# Altium footprint library Generic Footprint.PcbLib: 160 footprints (part 17 of 20) (continued)
## Symbol_FCC-Logo-9x6mm_Silkscreen [mm] (continued)
1(0.072,3.185) 1(0.072,3.195) 1(0.072,3.205) 1(0.072,3.215) 1(0.072,3.225) 1(0.072,3.236) 1(0.072,3.246) 1(0.072,3.256) 1(0.072,3.266) 1(0.072,3.276) 1(0.072,3.287) 1(0.072,3.297) 1(0.072,3.307) 1(0.072,3.317) 1(0.072,3.327) 1(0.072,3.338) 1(0.072,3.348) 1(0.072,3.358) 1(0.072,3.368) 1(0.072,3.378) 1(0.072,3.389) 1(0.072,3.399) 1(0.072,3.409) 1(0.072,3.419) 1(0.072,3.429) 1(0.072,3.44) 1(0.072,3.45) 1(0.072,3.46) 1(0.072,3.47) 1(0.072,3.48) 1(0.072,3.491) 1(0.072,3.501) 1(0.072,3.511) 1(0.072,3.521) 1(0.072,3.531) 1(0.072,3.542) 1(0.072,3.552) 1(0.072,3.562) 1(0.072,3.572) 1(0.072,3.582) 1(0.072,3.593) 1(0.072,3.603) 1(0.072,3.613) 1(0.072,3.623) 1(0.072,3.633) 1(0.072,3.644) 1(0.072,3.654) 1(0.072,3.664) 1(0.072,3.674) 1(0.072,3.684) 1(0.072,3.695) 1(0.072,3.705) 1(0.072,3.715) 1(0.072,3.725) 1(0.072,3.735) 1(0.072,3.746) 1(0.072,3.756) 1(0.072,3.766) 1(0.072,3.776) 1(0.072,3.786) 1(0.072,3.797) 1(0.072,3.807) 1(0.072,3.817) 1(0.072,3.827) 1(0.072,3.837) 1(0.072,3.848) 1(0.072,3.858) 1(0.072,3.868) 1(0.072,3.878) 1(0.072,3.888) 1(0.072,3.899) 1(0.072,3.909) 1(0.072,3.919) 1(0.072,3.929) 1(0.072,3.939) 1(0.072,3.95) 1(0.072,3.96) 1(0.072,3.97) 1(0.072,3.98) 1(0.072,3.99) 1(0.072,4.001) 1(0.072,4.011) 1(0.072,4.021) 1(0.072,4.031) 1(0.072,4.041) 1(0.072,4.052) 1(0.072,4.062) 1(0.072,4.072) 1(0.072,4.082) 1(0.072,4.092) 1(0.072,4.103) 1(0.072,4.113) 1(0.072,4.123) 1(0.072,4.133) 1(0.072,4.143) 1(0.072,4.154) 1(0.072,4.164) 1(0.072,4.174) 1(0.072,4.184) 1(0.072,4.194) 1(0.072,4.205) 1(0.072,4.215) 1(0.072,4.225) 1(0.072,4.235) 1(0.072,4.245) 1(0.072,4.256) 1(0.072,4.266) 1(0.072,4.276) 1(0.072,4.286) 1(0.072,4.296) 1(0.072,4.307) 1(0.072,4.317) 1(0.072,4.327) 1(0.072,4.337) 1(0.072,4.347) 1(0.072,4.358) 1(0.072,4.368) 1(0.072,4.378) 1(0.072,4.388) 1(0.072,4.398) 1(0.072,4.409) 1(0.072,4.419) 1(0.072,4.429) 1(0.072,4.439) 1(0.072,4.449) 1(0.072,4.46) 1(0.072,4.47) 1(0.072,4.48) 1(0.072,4.49) 1(0.072,4.5) 1(0.072,4.511) 1(0.072,4.521) 1(0.072,4.531) 1(0.072,4.541) 1(0.072,4.551) 1(0.072,4.562) 1(0.072,4.572) 1(0.072,4.582) 1(0.072,4.592) 1(0.072,4.602) 1(0.072,4.613) 1(0.072,4.623) 1(0.072,4.633) 1(0.072,4.643) 1(0.072,4.653) 1(0.072,4.664) 1(0.072,4.674) 1(0.072,4.684) 1(0.072,4.694) 1(0.072,4.704) 1(0.072,4.715) 1(0.072,4.725) 1(0.072,4.735) 1(0.072,4.745) 1(0.072,4.755) 1(0.072,4.766) 1(0.072,4.776) 1(0.072,4.786) 1(0.072,4.796) 1(0.072,4.806) 1(0.072,4.817) 1(0.072,4.827) 1(0.072,4.837) 1(0.072,4.847) 1(0.072,4.857) 1(0.072,4.868) 1(0.072,4.878) 1(0.072,4.888) 1(0.072,4.898) 1(0.072,4.908) 1(0.072,4.919) 1(0.072,4.929) 1(0.072,4.939) 1(0.072,4.949) 1(0.072,4.959) 1(0.072,4.97) 1(0.072,4.98) 1(0.072,4.99) 1(0.072,5) 1(0.072,5.01) 1(0.072,5.021) 1(0.072,5.031) 1(0.072,5.041) 1(0.072,5.051) 1(0.072,5.061) 1(0.072,5.072) 1(0.072,5.082) 1(0.072,5.092) 1(0.072,5.102) 1(0.072,5.112) 1(0.072,5.123) 1(0.072,5.133) 1(0.072,5.143) 1(0.072,5.153) 1(0.072,5.163) 1(0.072,5.174) 1(0.072,5.184) 1(0.072,5.194) 1(0.072,5.204) 1(0.072,5.214) 1(0.072,5.225) 1(0.072,5.235) 1(0.072,5.245) 1(0.072,5.255) 1(0.072,5.265) 1(0.072,5.276) 1(0.072,5.286) 1(0.072,5.296) 1(0.072,5.306) 1(0.072,5.316) 1(0.072,5.327) 1(0.072,5.337) 1(0.072,5.347) 1(0.072,5.357) 1(0.072,5.367) 1(0.072,5.378) 1(0.072,5.388) 1(0.072,5.398) 1(0.072,5.408) 1(0.072,5.418) 1(0.072,5.429) 1(0.072,5.439) 1(0.072,5.449) 1(0.072,5.459) 1(0.072,5.48) 1(0.072,5.49) 1(0.072,5.5) 1(0.072,5.51) 1(0.072,5.52) 1(0.072,5.531) 1(0.072,5.541) 1(0.072,5.551) 1(0.083,0.104) 1(0.083,0.114) 1(0.083,0.125) 1(0.083,0.145) 1(0.083,5.49) 1(0.083,5.5) 1(0.083,5.51) 1(0.083,5.52) 1(0.083,5.531) 1(0.083,5.541) 1(0.083,5.551) 1(0.083,5.571) 1(0.083,5.582) 1(0.083,5.592) 1(0.093,0.114) 1(0.093,0.125) 1(0.093,0.135) 1(0.093,5.531) 1(0.093,5.541) 1(0.093,5.551) 1(0.093,5.561) 1(0.093,5.571) 1(0.093,5.582) 1(0.093,5.592) 1(0.093,5.612) 1(0.093,5.643) 1(0.103,0.094) 1(0.103,0.104) 1(0.103,5.571) 1(0.103,5.582) 1(0.103,5.592) 1(0.103,5.602) 1(0.103,5.612) 1(0.103,5.633) 1(0.113,0.084) 1(0.113,0.094) 1(0.113,0.104) 1(0.113,5.643) 1(0.113,5.663) 1(0.113,5.673) 1(0.113,5.684) 1(0.123,5.612) 1(0.123,5.622) 1(0.123,5.694) 1(0.134,0.074) 1(0.134,5.643) 1(0.134,5.653) 1(0.134,5.704) 1(0.134,5.714) 1(0.134,5.724) 1(0.134,5.735) 1(0.144,0.084) 1(0.144,0.094) 1(0.144,5.714) 1(0.144,5.724) 1(0.144,5.735) 1(0.144,5.755) 1(0.154,0.063) 1(0.154,5.714) 1(0.154,5.724) 1(0.154,5.735) 1(0.154,5.755) 1(0.164,0.074) 1(0.164,0.084) 1(0.174,5.745) 1(0.174,5.755) 1(0.174,5.796) 1(0.185,0.053) 1(0.185,5.765) 1(0.185,5.775) 1(0.185,5.786) 1(0.185,5.796) 1(0.185,5.816) 1(0.185,5.826) 1(0.185,5.837) 1(0.185,5.847) 1(0.195,0.043) 1(0.195,0.063) 1(0.195,0.074) 1(0.195,5.796) 1(0.195,5.806) 1(0.195,5.816) 1(0.195,5.826) 1(0.195,5.857) 1(0.205,5.816) 1(0.205,5.826) 1(0.205,5.847) 1(0.205,5.857) 1(0.205,5.867) 1(0.215,5.847) 1(0.215,5.857) 1(0.215,5.877) 1(0.225,5.888) 1(0.225,5.898) 1(0.236,5.898) 1(0.236,5.908) 1(0.246,5.898) 1(0.246,5.908) 1(0.246,5.928) 1(0.246,5.939) 1(0.256,5.908) 1(0.256,5.928) 1(0.256,5.939) 1(0.256,5.959) 1(0.266,5.918) 1(0.266,5.949) 1(0.266,5.969) 1(0.276,5.928) 1(0.276,5.939) 1(0.276,5.949) 1(0.276,5.959) 1(0.287,5.949) 1(0.287,5.959) 1(0.287,5.979) 1(0.287,5.99) 1(0.287,6) 1(0.297,6.01) 1(0.307,6.02) 1(0.327,6.041) 1(0.327,6.051) 1(0.338,6.041) 1(0.338,6.051) 1(0.338,6.061) 1(0.348,6.03) 1(0.348,6.041) 1(0.348,6.061) 1(0.348,6.071) 1(0.358,6.051) 1(0.358,6.071) 1(0.358,6.081) 1(0.368,6.061) 1(0.368,6.071) 1(0.368,6.092) 1(0.378,6.081) 1(0.378,6.102) 1(0.389,6.081) 1(0.389,6.112) 1(0.399,6.122) 1(0.409,6.112) 1(0.409,6.132) 1(0.419,6.112) 1(0.419,6.122) 1(0.419,6.143) 1(0.429,6.122) 1(0.429,6.132) 1(0.429,6.153) 1(0.44,6.132) 1(0.44,6.143) 1(0.44,6.153) 1(0.44,6.163) 1(0.45,6.143) 1(0.45,6.163) 1(0.45,6.173) 1(0.46,6.153) 1(0.46,6.183) 1(0.47,6.163) 1(0.48,6.194) 1(0.491,6.204) 1(0.501,6.214) 1(0.511,6.204) 1(0.521,6.224) 1(0.531,6.204) 1(0.531,6.234) 1(0.542,6.245) 1(0.552,6.234) 1(0.552,6.245) 1(0.552,6.255) 1(0.572,6.234) 1(0.572,6.255) 1(0.572,6.265) 1(0.582,6.245) 1(0.603,6.255) 1(0.603,6.275) 1(0.613,6.285) 1(0.623,6.296) 1(0.654,6.285) 1(0.654,6.296) 1(0.654,6.306) 1(0.674,6.285) 1(0.674,6.296) 1(0.684,6.306) 1(0.684,6.316) 1(0.705,6.306) 1(0.705,6.316) 1(0.705,6.326) 1(0.746,6.316) 1(0.746,6.326) 1(0.746,6.336) 1(0.776,6.347) 1(0.786,6.326) 1(0.786,6.357) 1(0.797,6.336) 1(0.848,6.336) 1(0.858,6.367) 1(1.062,0.053) 1(1.062,0.094) 1(1.062,0.104) 1(1.062,0.114) 1(1.062,0.125) 1(1.062,0.135) 1(1.062,0.145) 1(1.062,0.155) 1(1.062,0.165) 1(1.062,0.176) 1(1.062,0.186) 1(1.062,0.196) 1(1.062,0.206) 1(1.062,0.216) 1(1.062,0.227) 1(1.062,0.237) 1(1.062,0.247) 1(1.062,0.257) 1(1.062,0.267) 1(1.062,0.278) 1(1.062,0.288) 1(1.062,0.298) 1(1.062,0.308) 1(1.062,0.318) 1(1.062,0.329) 1(1.062,0.339) 1(1.062,0.349) 1(1.062,0.359) 1(1.062,0.369) 1(1.062,0.38) 1(1.062,0.39) 1(1.062,0.4) 1(1.062,0.41) 1(1.062,0.42) 1(1.062,0.431) 1(1.062,0.441) 1(1.062,0.451) 1(1.062,0.461) 1(1.062,0.471) 1(1.062,0.482) 1(1.062,0.492) 1(1.062,0.502) 1(1.062,0.512) 1(1.062,0.522) 1(1.062,0.533) 1(1.062,0.543) 1(1.062,0.553) 1(1.062,0.563) 1(1.062,0.573) 1(1.062,0.584) 1(1.062,0.594) 1(1.062,0.604) 1(1.062,0.614) 1(1.062,0.624) 1(1.062,0.635) 1(1.062,0.645) 1(1.062,0.655) 1(1.062,0.665) 1(1.062,0.675) 1(1.062,0.686) 1(1.062,0.696) 1(1.062,0.706) 1(1.062,0.716) 1(1.062,0.726) 1(1.062,0.737) 1(1.062,0.747) 1(1.062,0.757) 1(1.062,0.767) 1(1.062,0.777) 1(1.062,0.788) 1(1.062,0.798) 1(1.062,0.808) 1(1.062,0.818) 1(1.062,0.828) 1(1.062,0.839) 1(1.062,0.849) 1(1.062,0.859) 1(1.062,0.869) 1(1.062,0.879) 1(1.062,0.89) 1(1.062,0.9) 1(1.062,0.91) 1(1.062,0.92) 1(1.062,0.93) 1(1.062,0.941) 1(1.062,0.951) 1(1.062,0.961) 1(1.062,0.971) 1(1.062,0.981) 1(1.062,0.992) 1(1.062,1.002) 1(1.062,1.012) 1(1.062,1.022) 1(1.062,1.032) 1(1.062,1.043) 1(1.062,1.053) 1(1.062,1.063) 1(1.062,1.073) 1(1.062,1.083) 1(1.062,1.094) 1(1.062,1.104) 1(1.062,1.114) 1(1.062,1.124) 1(1.062,1.134) 1(1.062,1.145) 1(1.062,1.155) 1(1.062,1.165) 1(1.062,1.175) 1(1.062,1.185) 1(1.062,1.196) 1(1.062,1.206) 1(1.062,1.216) 1(1.062,1.226) 1(1.062,1.236) 1(1.062,1.247) 1(1.062,1.257) 1(1.062,1.267) 1(1.062,1.277) 1(1.062,1.287) 1(1.062,1.298) 1(1.062,1.308) 1(1.062,1.318) 1(1.062,1.328) 1(1.062,1.338) 1(1.062,1.349) 1(1.062,1.359) 1(1.062,1.369) 1(1.062,1.379) 1(1.062,1.389) 1(1.062,1.4) 1(1.062,1.41) 1(1.062,1.42) 1(1.062,1.43) 1(1.062,1.44) 1(1.062,1.451) 1(1.062,1.461) 1(1.062,1.471) 1(1.062,1.481) 1(1.062,1.491) 1(1.062,1.502) 1(1.062,1.512) 1(1.062,1.522) 1(1.062,1.532) 1(1.062,1.542) 1(1.062,1.553) 1(1.062,1.563) 1(1.062,1.573) 1(1.062,1.583) 1(1.062,1.593) 1(1.062,1.604) 1(1.062,1.614) 1(1.062,1.624) 1(1.062,1.634) 1(1.062,1.644) 1(1.062,1.655) 1(1.062,1.665) 1(1.062,1.675) 1(1.062,1.685) 1(1.062,1.695) 1(1.062,1.706) 1(1.062,1.716) 1(1.062,1.726) 1(1.062,1.736) 1(1.062,1.746) 1(1.062,1.757) 1(1.062,1.767) 1(1.062,1.777) 1(1.062,1.787) 1(1.062,1.797) 1(1.062,1.808) 1(1.062,1.818) 1(1.062,1.828) 1(1.062,1.838) 1(1.062,1.848) 1(1.062,1.859) 1(1.062,1.869) 1(1.062,1.879) 1(1.062,1.889) 1(1.062,1.899) 1(1.062,1.91) 1(1.062,1.92) 1(1.062,1.93) 1(1.062,1.94) 1(1.062,1.95) 1(1.062,1.961) 1(1.062,1.971) 1(1.062,1.981) 1(1.062,1.991) 1(1.062,2.001) 1(1.062,2.012) 1(1.062,2.022) 1(1.062,2.032) 1(1.062,2.042) 1(1.062,2.052) 1(1.062,2.063) 1(1.062,2.073) 1(1.062,2.083) 1(1.062,2.093) 1(1.062,2.103) 1(1.062,2.114) 1(1.062,2.124) 1(1.062,2.134) 1(1.062,2.144) 1(1.062,2.154) 1(1.062,2.165) 1(1.062,2.175) 1(1.062,2.185) 1(1.062,2.195) 1(1.062,2.205) 1(1.062,2.216) 1(1.062,2.226) 1(1.062,2.236) 1(1.062,2.246) 1(1.062,2.256) 1(1.062,2.267) 1(1.062,2.277) 1(1.062,2.287) 1(1.062,2.297) 1(1.062,2.307) 1(1.062,2.318) 1(1.062,2.328) 1(1.062,2.338) 1(1.062,2.348) 1(1.062,2.358) 1(1.062,2.369) 1(1.062,2.379) 1(1.062,2.389) 1(1.062,2.399) 1(1.062,2.409) 1(1.062,2.42) 1(1.062,2.43) 1(1.062,2.44) 1(1.062,2.45) 1(1.062,2.46) 1(1.062,2.471) 1(1.062,2.481) 1(1.062,2.491) 1(1.062,2.501) 1(1.062,2.511) 1(1.062,2.522) 1(1.062,2.532) 1(1.062,2.542) 1(1.062,2.552) 1(1.062,2.562) 1(1.062,2.573) 1(1.062,2.583) 1(1.062,2.593) 1(1.062,2.603) 1(1.062,2.613) 1(1.062,2.624) 1(1.062,2.634) 1(1.062,2.644) 1(1.062,2.654) 1(1.062,2.675) 1(1.062,5.133) 1(1.062,5.143) 1(1.072,0.043) 1(1.072,0.094) 1(1.072,0.104) 1(1.072,0.114) 1(1.072,0.125) 1(1.072,0.135) 1(1.072,0.145) 1(1.072,0.155) 1(1.072,0.165) 1(1.072,0.176) 1(1.072,0.186) 1(1.072,0.196) 1(1.072,0.206) 1(1.072,0.216) 1(1.072,0.227) 1(1.072,0.237) 1(1.072,0.247) 1(1.072,0.257) 1(1.072,0.267) 1(1.072,0.278) 1(1.072,0.288) 1(1.072,0.298) 1(1.072,0.308) 1(1.072,0.318) 1(1.072,0.329) 1(1.072,0.339) 1(1.072,0.349) 1(1.072,0.359) 1(1.072,0.369) 1(1.072,0.38) 1(1.072,0.39) 1(1.072,0.4) 1(1.072,0.41) 1(1.072,0.42) 1(1.072,0.431) 1(1.072,0.441) 1(1.072,0.451) 1(1.072,0.461) 1(1.072,0.471) 1(1.072,0.482) 1(1.072,0.492) 1(1.072,0.502) 1(1.072,0.512) 1(1.072,0.522) 1(1.072,0.533) 1(1.072,0.543) 1(1.072,0.553) 1(1.072,0.563) 1(1.072,0.573) 1(1.072,0.584) 1(1.072,0.594) 1(1.072,0.604) 1(1.072,0.614) 1(1.072,0.624) 1(1.072,0.635) 1(1.072,0.645) 1(1.072,0.655) 1(1.072,0.665) 1(1.072,0.675) 1(1.072,0.686) 1(1.072,0.696) 1(1.072,0.706) 1(1.072,0.716) 1(1.072,0.726) 1(1.072,0.737) 1(1.072,0.747) 1(1.072,0.757) 1(1.072,0.767) 1(1.072,0.777) 1(1.072,0.788) 1(1.072,0.798) 1(1.072,0.808) 1(1.072,0.818) 1(1.072,0.828) 1(1.072,0.839) 1(1.072,0.849) 1(1.072,0.859) 1(1.072,0.869) 1(1.072,0.879) 1(1.072,0.89) 1(1.072,0.9) 1(1.072,0.91) 1(1.072,0.92) 1(1.072,0.93) 1(1.072,0.941) 1(1.072,0.951) 1(1.072,0.961) 1(1.072,0.971) 1(1.072,0.981) 1(1.072,0.992) 1(1.072,1.002) 1(1.072,1.012) 1(1.072,1.022) 1(1.072,1.032) 1(1.072,1.043) 1(1.072,1.053) 1(1.072,1.063) 1(1.072,1.073) 1(1.072,1.083) 1(1.072,1.094) 1(1.072,1.104) 1(1.072,1.114) 1(1.072,1.124) 1(1.072,1.134) 1(1.072,1.145) 1(1.072,1.155) 1(1.072,1.165) 1(1.072,1.175) 1(1.072,1.185) 1(1.072,1.196) 1(1.072,1.206) 1(1.072,1.216) 1(1.072,1.226) 1(1.072,1.236) 1(1.072,1.247) 1(1.072,1.257) 1(1.072,1.267) 1(1.072,1.277) 1(1.072,1.287) 1(1.072,1.298) 1(1.072,1.308) 1(1.072,1.318) 1(1.072,1.328) 1(1.072,1.338) 1(1.072,1.349) 1(1.072,1.359) 1(1.072,1.369) 1(1.072,1.379) 1(1.072,1.389) 1(1.072,1.4) 1(1.072,1.41) 1(1.072,1.42) 1(1.072,1.43) 1(1.072,1.44) 1(1.072,1.451) 1(1.072,1.461) 1(1.072,1.471) 1(1.072,1.481) 1(1.072,1.491) 1(1.072,1.502) 1(1.072,1.512) 1(1.072,1.522) 1(1.072,1.532) 1(1.072,1.542) 1(1.072,1.553) 1(1.072,1.563) 1(1.072,1.573) 1(1.072,1.583) 1(1.072,1.593) 1(1.072,1.604) 1(1.072,1.614) 1(1.072,1.624) 1(1.072,1.634) 1(1.072,1.644) 1(1.072,1.655) 1(1.072,1.665) 1(1.072,1.675) 1(1.072,1.685) 1(1.072,1.695) 1(1.072,1.706) 1(1.072,1.716) 1(1.072,1.726) 1(1.072,1.736) 1(1.072,1.746) 1(1.072,1.757) 1(1.072,1.767) 1(1.072,1.777) 1(1.072,1.787) 1(1.072,1.797) 1(1.072,1.808) 1(1.072,1.818) 1(1.072,1.828) 1(1.072,1.838) 1(1.072,1.848) 1(1.072,1.859) 1(1.072,1.869) 1(1.072,1.879) 1(1.072,1.889) 1(1.072,1.899) 1(1.072,1.91) 1(1.072,1.92) 1(1.072,1.93) 1(1.072,1.94) 1(1.072,1.95) 1(1.072,1.961) 1(1.072,1.971) 1(1.072,1.981) 1(1.072,1.991) 1(1.072,2.001) 1(1.072,2.012) 1(1.072,2.022) 1(1.072,2.032) 1(1.072,2.042) 1(1.072,2.052) 1(1.072,2.063) 1(1.072,2.073) 1(1.072,2.083) 1(1.072,2.093) 1(1.072,2.103) 1(1.072,2.114) 1(1.072,2.124) 1(1.072,2.134) 1(1.072,2.144) 1(1.072,2.154) 1(1.072,2.165) 1(1.072,2.175) 1(1.072,2.185) 1(1.072,2.195) 1(1.072,2.205) 1(1.072,2.216) 1(1.072,2.226) 1(1.072,2.236) 1(1.072,2.246) 1(1.072,2.256) 1(1.072,2.267) 1(1.072,2.277) 1(1.072,2.287) 1(1.072,2.297) 1(1.072,2.307) 1(1.072,2.318) 1(1.072,2.328) 1(1.072,2.338) 1(1.072,2.348) 1(1.072,2.358) 1(1.072,2.369) 1(1.072,2.379) 1(1.072,2.389) 1(1.072,2.399) 1(1.072,2.409) 1(1.072,2.42) 1(1.072,2.43) 1(1.072,2.44) 1(1.072,2.45) 1(1.072,2.46) 1(1.072,2.471) 1(1.072,2.481) 1(1.072,2.491) 1(1.072,2.501) 1(1.072,2.511) 1(1.072,2.522) 1(1.072,2.532) 1(1.072,2.542) 1(1.072,2.552) 1(1.072,2.562) 1(1.072,2.573) 1(1.072,2.583) 1(1.072,2.593) 1(1.072,2.603) 1(1.072,2.613) 1(1.072,2.624) 1(1.072,2.634) 1(1.072,2.644) 1(1.072,2.654) 1(1.072,2.675) 1(1.072,2.705) 1(1.072,5.133) 1(1.072,5.143) 1(1.072,5.153) 1(1.072,5.163) 1(1.082,0.063) 1(1.082,0.074) 1(1.082,2.695) 1(1.082,3.531) 1(1.082,3.542) 1(1.082,3.552) 1(1.082,3.562) 1(1.082,3.572) 1(1.082,3.582) 1(1.082,3.593) 1(1.082,3.603) 1(1.082,3.613) 1(1.082,3.623) 1(1.082,3.633) 1(1.082,3.644) 1(1.082,3.654) 1(1.082,3.664) 1(1.082,3.674) 1(1.082,3.684) 1(1.082,3.695) 1(1.082,3.705) 1(1.082,3.715) 1(1.082,3.725) 1(1.082,3.735) 1(1.082,3.746) 1(1.082,3.756) 1(1.082,3.766) 1(1.082,3.776) 1(1.082,3.786) 1(1.082,3.797) 1(1.082,3.807) 1(1.082,3.817) 1(1.082,3.827) 1(1.082,3.837) 1(1.082,3.848) 1(1.082,3.858) 1(1.082,3.868) 1(1.082,3.878) 1(1.082,3.888) 1(1.082,3.899) 1(1.082,3.909) 1(1.082,3.919) 1(1.082,3.929) 1(1.082,3.939) 1(1.082,3.95) 1(1.082,3.96) 1(1.082,3.97) 1(1.082,3.98) 1(1.082,3.99) 1(1.082,4.001) 1(1.082,4.011) 1(1.082,4.021) 1(1.082,4.031) 1(1.082,4.041) 1(1.082,4.052) 1(1.082,4.062) 1(1.082,4.072) 1(1.082,4.082) 1(1.082,4.092) 1(1.082,4.103) 1(1.082,4.113) 1(1.082,4.123) 1(1.082,4.133) 1(1.082,4.143) 1(1.082,4.154) 1(1.082,4.164) 1(1.082,4.174) 1(1.082,4.184) 1(1.082,4.194) 1(1.082,4.205) 1(1.082,4.215) 1(1.082,4.225) 1(1.082,4.235) 1(1.082,4.245) 1(1.082,4.256) 1(1.082,4.266) 1(1.082,4.276) 1(1.082,4.286) 1(1.082,4.296) 1(1.082,4.307) 1(1.082,4.317) 1(1.082,4.327) 1(1.082,4.337) 1(1.082,4.347) 1(1.082,4.358) 1(1.082,4.368) 1(1.082,4.378) 1(1.082,4.388) 1(1.082,4.398) 1(1.082,4.409) 1(1.082,4.419) 1(1.082,4.429) 1(1.082,4.439) 1(1.082,4.449) 1(1.082,4.46) 1(1.082,4.47) 1(1.082,4.48) 1(1.082,4.49) 1(1.082,4.5) 1(1.082,4.511) 1(1.082,4.521) 1(1.082,4.531) 1(1.082,4.541) 1(1.082,4.551) 1(1.082,4.562) 1(1.082,4.572) 1(1.082,4.582) 1(1.082,4.592) 1(1.082,4.602) 1(1.082,4.613) 1(1.082,4.623) 1(1.082,4.633) 1(1.082,4.643) 1(1.082,4.653) 1(1.082,4.664) 1(1.082,4.674) 1(1.082,4.684) 1(1.082,4.694) 1(1.082,4.704) 1(1.082,4.715) 1(1.082,4.725) 1(1.082,4.735) 1(1.082,4.745) 1(1.082,4.755) 1(1.082,4.766) 1(1.082,4.776) 1(1.082,4.786) 1(1.082,4.796) 1(1.082,4.806) 1(1.082,4.817) 1(1.082,4.827) 1(1.082,4.837) 1(1.082,4.847) 1(1.082,4.857) 1(1.082,4.868) 1(1.082,4.878) 1(1.082,4.888) 1(1.082,4.898) 1(1.082,4.908) 1(1.082,4.919) 1(1.082,4.929) 1(1.082,4.939) 1(1.082,4.949) 1(1.082,4.959) 1(1.082,4.97) 1(1.082,4.98) 1(1.082,4.99) 1(1.082,5) 1(1.082,5.01) 1(1.082,5.021) 1(1.082,5.031) 1(1.082,5.041) 1(1.082,5.051) 1(1.082,5.061) 1(1.082,5.072) 1(1.082,5.082) 1(1.082,5.092) 1(1.082,5.102) 1(1.082,5.112) 1(1.082,5.123) 1(1.082,5.143) 1(1.092,0.063) 1(1.092,0.084) 1(1.092,0.094) 1(1.092,0.104) 1(1.092,0.114) 1(1.092,0.125) 1(1.092,0.135) 1(1.092,0.145) 1(1.092,0.155) 1(1.092,0.165) 1(1.092,0.176) 1(1.092,0.186) 1(1.092,0.196) 1(1.092,0.206) 1(1.092,0.216) 1(1.092,0.227) 1(1.092,0.237) 1(1.092,0.247) 1(1.092,0.257) 1(1.092,0.267) 1(1.092,0.278) 1(1.092,0.288) 1(1.092,0.298) 1(1.092,0.308) 1(1.092,0.318) 1(1.092,0.329) 1(1.092,0.339) 1(1.092,0.349) 1(1.092,0.359) 1(1.092,0.369) 1(1.092,0.38) 1(1.092,0.39) 1(1.092,0.4) 1(1.092,0.41) 1(1.092,0.42) 1(1.092,0.431) 1(1.092,0.441) 1(1.092,0.451) 1(1.092,0.461) 1(1.092,0.471) 1(1.092,0.482) 1(1.092,0.492) 1(1.092,0.502) 1(1.092,0.512) 1(1.092,0.522) 1(1.092,0.533) 1(1.092,0.543) 1(1.092,0.553) 1(1.092,0.563) 1(1.092,0.573) 1(1.092,0.584) 1(1.092,0.594) 1(1.092,0.604) 1(1.092,0.614) 1(1.092,0.624) 1(1.092,0.635) 1(1.092,0.645) 1(1.092,0.655) 1(1.092,0.665) 1(1.092,0.675) 1(1.092,0.686) 1(1.092,0.696) 1(1.092,0.706) 1(1.092,0.716) 1(1.092,0.726) 1(1.092,0.737) 1(1.092,0.747) 1(1.092,0.757) 1(1.092,0.767) 1(1.092,0.777) 1(1.092,0.788) 1(1.092,0.798) 1(1.092,0.808) 1(1.092,0.818) 1(1.092,0.828) 1(1.092,0.839) 1(1.092,0.849) 1(1.092,0.859) 1(1.092,0.869) 1(1.092,0.879) 1(1.092,0.89) 1(1.092,0.9) 1(1.092,0.91) 1(1.092,0.92) 1(1.092,0.93) 1(1.092,0.941) 1(1.092,0.951) 1(1.092,0.961) 1(1.092,0.971) 1(1.092,0.981) 1(1.092,0.992) 1(1.092,1.002) 1(1.092,1.012) 1(1.092,1.022) 1(1.092,1.032) 1(1.092,1.043) 1(1.092,1.053) 1(1.092,1.063) 1(1.092,1.073) 1(1.092,1.083) 1(1.092,1.094) 1(1.092,1.104) 1(1.092,1.114) 1(1.092,1.124) 1(1.092,1.134) 1(1.092,1.145) 1(1.092,1.155) 1(1.092,1.165) 1(1.092,1.175) 1(1.092,1.185) 1(1.092,1.196) 1(1.092,1.206) 1(1.092,1.216) 1(1.092,1.226) 1(1.092,1.236) 1(1.092,1.247) 1(1.092,1.257) 1(1.092,1.267) 1(1.092,1.277) 1(1.092,1.287) 1(1.092,1.298) 1(1.092,1.308) 1(1.092,1.318) 1(1.092,1.328) 1(1.092,1.338) 1(1.092,1.349) 1(1.092,1.359) 1(1.092,1.369) 1(1.092,1.379) 1(1.092,1.389) 1(1.092,1.4) 1(1.092,1.41) 1(1.092,1.42) 1(1.092,1.43) 1(1.092,1.44) 1(1.092,1.451) 1(1.092,1.461) 1(1.092,1.471) 1(1.092,1.481) 1(1.092,1.491) 1(1.092,1.502) 1(1.092,1.512) 1(1.092,1.522) 1(1.092,1.532) 1(1.092,1.542) 1(1.092,1.553) 1(1.092,1.563) 1(1.092,1.573) 1(1.092,1.583) 1(1.092,1.593) 1(1.092,1.604) 1(1.092,1.614) 1(1.092,1.624) 1(1.092,1.634) 1(1.092,1.644) 1(1.092,1.655) 1(1.092,1.665) 1(1.092,1.675) 1(1.092,1.685) 1(1.092,1.695) 1(1.092,1.706) 1(1.092,1.716) 1(1.092,1.726) 1(1.092,1.736) 1(1.092,1.746) 1(1.092,1.757) 1(1.092,1.767) 1(1.092,1.777) 1(1.092,1.787) 1(1.092,1.797) 1(1.092,1.808) 1(1.092,1.818) 1(1.092,1.828) 1(1.092,1.838) 1(1.092,1.848) 1(1.092,1.859) 1(1.092,1.869) 1(1.092,1.879) 1(1.092,1.889) 1(1.092,1.899) 1(1.092,1.91) 1(1.092,1.92) 1(1.092,1.93) 1(1.092,1.94) 1(1.092,1.95) 1(1.092,1.961) 1(1.092,1.971) 1(1.092,1.981) 1(1.092,1.991) 1(1.092,2.001) 1(1.092,2.012) 1(1.092,2.022) 1(1.092,2.032) 1(1.092,2.042) 1(1.092,2.052) 1(1.092,2.063) 1(1.092,2.073) 1(1.092,2.083) 1(1.092,2.093) 1(1.092,2.103) 1(1.092,2.114) 1(1.092,2.124) 1(1.092,2.134) 1(1.092,2.144) 1(1.092,2.154) 1(1.092,2.165) 1(1.092,2.175) 1(1.092,2.185) 1(1.092,2.195) 1(1.092,2.205) 1(1.092,2.216) 1(1.092,2.226) 1(1.092,2.236) 1(1.092,2.246) 1(1.092,2.256) 1(1.092,2.267) 1(1.092,2.277) 1(1.092,2.287) 1(1.092,2.297) 1(1.092,2.307) 1(1.092,2.318) 1(1.092,2.328) 1(1.092,2.338) 1(1.092,2.348) 1(1.092,2.358) 1(1.092,2.369) 1(1.092,2.379) 1(1.092,2.389) 1(1.092,2.399) 1(1.092,2.409) 1(1.092,2.42) 1(1.092,2.43) 1(1.092,2.44) 1(1.092,2.45) 1(1.092,2.46) 1(1.092,2.471) 1(1.092,2.481) 1(1.092,2.491) 1(1.092,2.501) 1(1.092,2.511) 1(1.092,2.522) 1(1.092,2.532) 